# Altium footprint library Conectori.PcbLib: 65 footprints (part 3 of 5)
Each footprint in its own frame and in the unit in brackets; x right, y up, seen from the top. Pads: shape width x height; smd on the part's side, far side on the other; paste and mask are expansions set on the pad; w line width, h text height; cw(c..) or ccw(c..) is an arc to the next point about the centre after c.
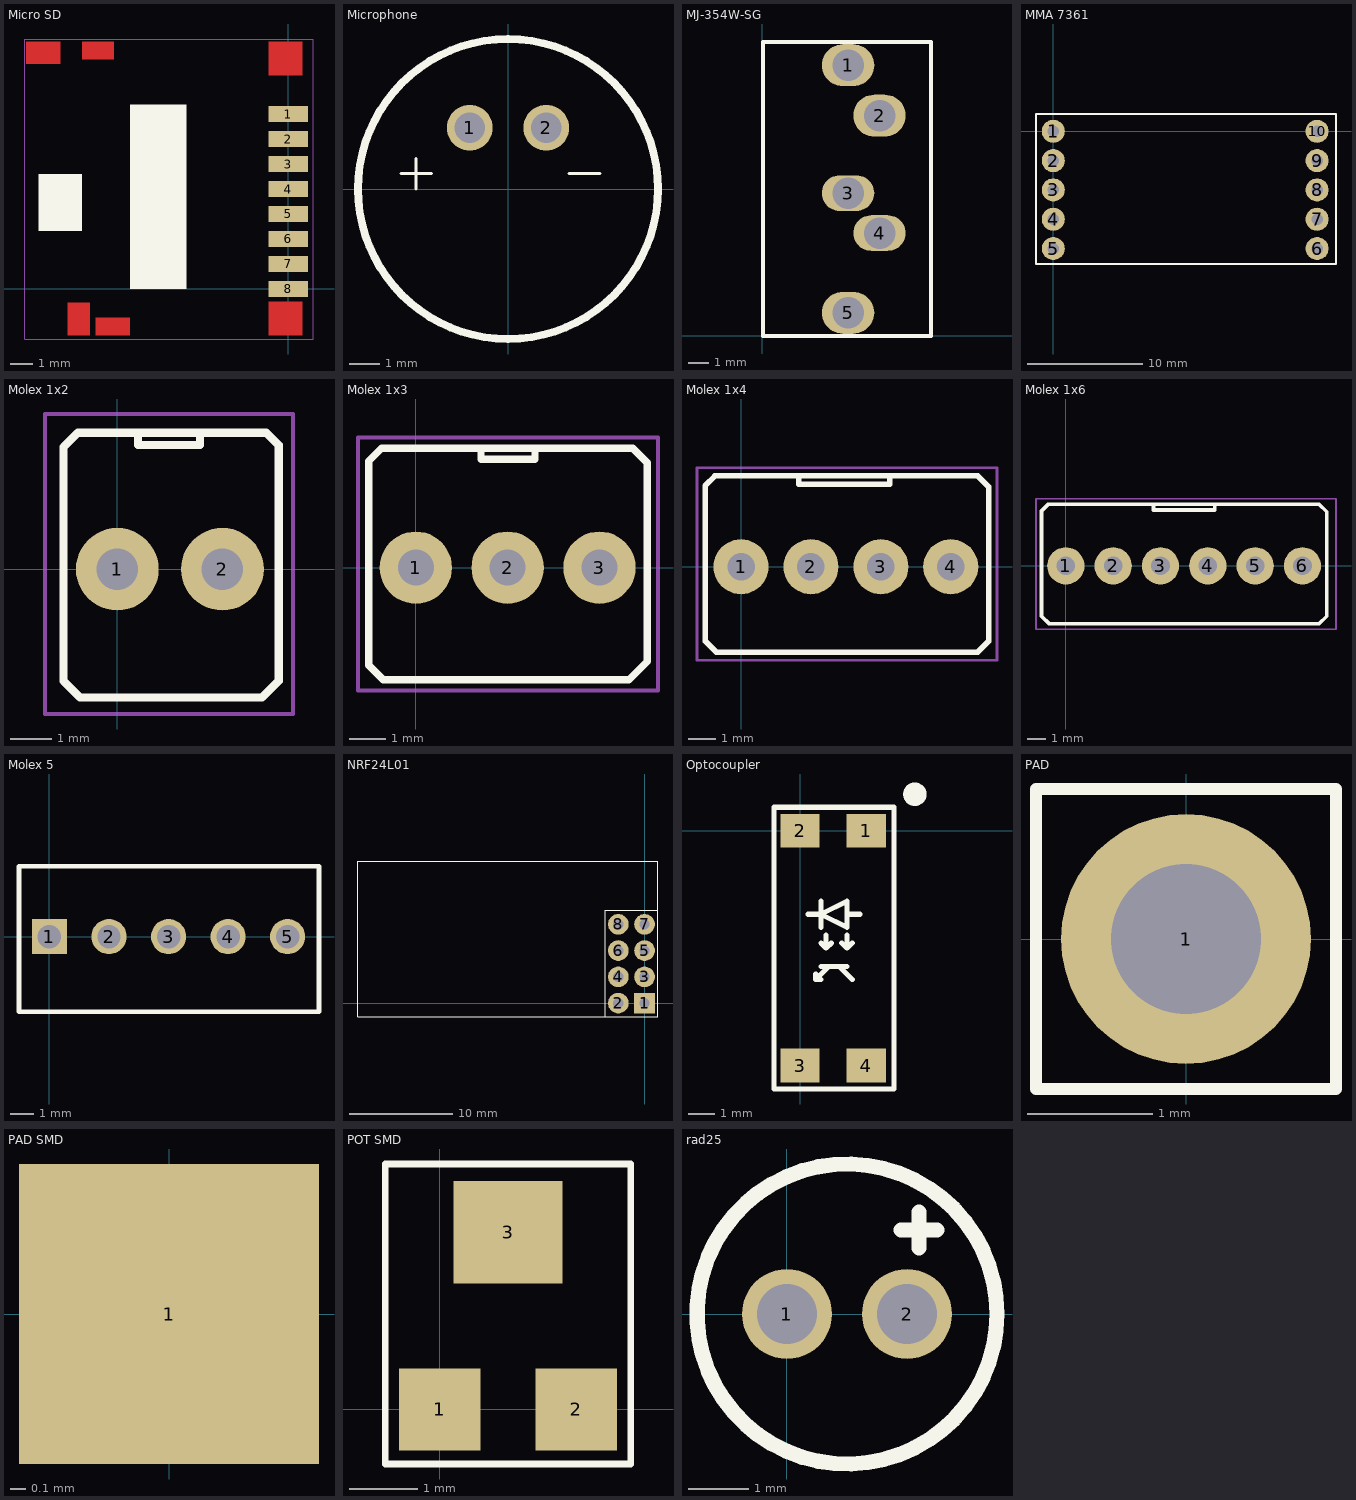
[diagram p2: the footprints below, top view; thin cyan lines are the x and y axes]

## Micro SD [mm]
height 1.55
pads (8):
  rect 1.75x0.7 smd: 1(0,7.7) 2(0,6.6) 3(0,5.5) 4(0,4.4) 5(0,3.3) 6(0,2.2) 7(0,1.1) 8(0,0)
Top Layer:
  rectangle: -9.075,10.1 -7.675,10.9
  rectangle: -9.725,-2.05 -8.725,-0.6
  rectangle: -8.475,-2.05 -6.975,-1.25
  rectangle: -0.875,9.4 0.625,10.9
  rectangle: -0.875,-2.05 0.625,-0.55
  rectangle: -11.55,9.9 -10.025,10.9
Top Overlay:
  rectangle: -11,2.55 -9.075,5.05
  rectangle: -6.975,0 -4.475,8.125
Mechanical 15:
  lines w0.05: -11.6,-2.2 -11.6,11 1.1,11 1.1,-2.2 -11.6,-2.2
3D body "User Library-49225-0811 micro sd.step": height 1.05, standoff -0.93, extent -13.2,-4.025 2.9,13.025

## Microphone [mm]
pads (2):
  round 1.5 hole 1: 1(-1.25,2) 2(1.25,2)
Top Overlay:
  circle w0.254: c0,0 r4.9
  lines w0.1: -3.5,0.5 -2.75,0.5 -2.5,0.5 ; -3,0 -3,1 ; 2,0.5 3,0.5
3D body "User Library-Panasonic_Microphone_WM52BM.step": height 5.15, standoff -4.02, extent -4.85,-4.85 4.85,4.85

## MJ-354W-SG [mm]
pads (5):
  oval 2.5x2 hole 1.5: 1(4.1,12.9) 2(5.6,10.5) 5(4.1,1.1)
  oval 2.5x1.7 hole 1.5: 3(4.1,6.8) 4(5.6,4.9)
Top Layer:
  lines w0.2: 3.2,1.4 4.7,1.4 ; 3.35,6.8 4.85,6.8 ; 3.35,12.9 4.85,12.9 ; 4.85,4.9 6.35,4.9 ; 4.85,10.5 6.35,10.5
Top Overlay:
  lines w0.2: 4.85,14 8.05,14 ; 8.05,14 8.05,0 0.05,0 0.05,14 8.05,14
3D body "mj-3502n.stp": height 11.4, standoff -4.4, extent 0.398,-0.075 7.752,18.425

## MMA 7361 [mm] "Accelerometer"
pads (10):
  round 2 hole 1: 1(0,0) 2(0,-2.54) 3(0,-5.08) 4(0,-7.62) 5(0,-10.16) 6(22.86,-10.16) 7(22.86,-7.62) 8(22.86,-5.08) 9(22.86,-2.54) 10(22.86,0)
Top Overlay:
  lines w0.2: -1.5,-11.5 24.5,-11.5 24.5,1.5 -1.5,1.5 -1.5,-11.5

## Molex 1x2 [mm]
height 13
pads (2):
  round 2 hole 1: 1(0,0) 2(2.54,0)
Top Overlay:
  lines w0.2: 0.5,3.3 0.5,3 2,3 2,3.3 ; -1.3,-2.7 -0.9,-3.1 0.9,-3.1 3.5,-3.1 3.9,-2.7 3.9,3 3.6,3.3 -0.95,3.3 -1.3,2.95 -1.3,-2.7
Mechanical 15:
  lines w0.1: -1.75,-3.5 -1.75,3.75 4.25,3.75 4.25,-3.5 -1.75,-3.5
3D body "SW3dPS-Molex - 2-Pin Header with Lock (0.100in pitch).STEP": height 10.69, standoff -3.53, extent -1.24,-3.1 3.84,3.25

## Molex 1x3 [mm]
height 10
pads (3):
  round 2 hole 1: 1(0,0) 2(2.54,0) 3(5.08,0)
Top Overlay:
  lines w0.2: 1.8,3.3 1.8,3 3.3,3 3.3,3.3 ; -1.3,-2.7 -0.9,-3.1 0.9,-3.1 5.9,-3.1 6.4,-2.6 6.4,2.9 6,3.3 -0.95,3.3 -1.3,2.95 -1.3,-2.7
Mechanical 15:
  lines w0.1: -1.6,-3.4 -1.6,3.6 6.7,3.6 6.7,-3.4 -1.6,-3.4
3D body "SW3dPS-Molex - 3-Pin Header with Lock (0.100in pitch).STEP": height 10.69, standoff -3.53, extent -1.32,-3.075 6.3,3.275

## Molex 1x4 [mm]
height 10
pads (4):
  round 2 hole 1: 1(0,0) 2(2.54,0) 3(5.08,0) 4(7.62,0)
Top Overlay:
  lines w0.2: 2.1,3.3 2.1,3 5.4,3 5.4,3.3 ; -1.3,-2.7 -0.9,-3.1 0.9,-3.1 8.6,-3.1 9,-2.7 9,2.9 8.6,3.3 -0.95,3.3 -1.3,2.95 -1.3,-2.7
Mechanical 15:
  lines w0.1: -1.6,-3.4 -1.6,3.6 9.3,3.6 9.3,-3.4 -1.6,-3.4
3D body "User Library-Molex 4 pines.step": height 11.5, standoff -3.2, extent -1.25,-3.1 8.9,2.9

## Molex 1x6 [mm]
height 10
pads (6):
  round 2 hole 1: 1(0,0) 2(2.54,0) 3(5.08,0) 4(7.62,0) 5(10.16,0) 6(12.7,0)
Top Overlay:
  lines w0.2: 4.7,3.3 4.7,3 8,3 8,3.3 ; -1.3,-2.7 -0.9,-3.1 0.9,-3.1 13.6,-3.1 14,-2.7 14,2.9 13.6,3.3 -0.95,3.3 -1.3,2.95 -1.3,-2.7
Mechanical 15:
  lines w0.1: -1.6,-3.4 -1.6,3.6 14.5,3.6 14.5,-3.4 -1.6,-3.4
3D body "User Library-Molex 6 pines.step": height 11.5, standoff -3.2, extent -1.13,-3 13.93,3

## Molex 5 [mm]
pads (5):
  rect 1.5x1.5 hole 1: 1(0,0)
  round 1.5 hole 1: 2(2.54,0) 3(5.08,0) 4(7.62,0) 5(10.16,0)
Top Overlay:
  lines w0.2: -1.3,-3.2 -1.3,3 11.5,3 11.5,-3.2 -1.3,-3.2
3D body "User Library-Molex 5 pines.step": height 11.5, standoff -3.2, extent -1.16,-3.1 11.36,2.9

## NRF24L01 [mm]
pads (8):
  rect 2x2 hole 1: 1(0,0)
  round 2 hole 1: 2(-2.54,0) 3(0,2.54) 4(-2.54,2.54) 5(0,5.08) 6(-2.54,5.08) 7(0,7.62) 8(-2.54,7.62)
Top Overlay:
  lines w0.1: -3.8,-1.3 -3.8,9 1.3,9 ; -27.7,-1.3 1.3,-1.3 1.3,13.7 -27.7,13.7 -27.7,-1.3

## Optocoupler [mm]
height 5
pads (4):
  rect 1.5x1.3 smd: 1(2.54,0) 2(0,0) 3(0,-9) 4(2.54,-9)
Top Overlay:
  circle w0.5: c4.4,1.4 r0.2
  lines w0.2: 0.3,-3.2 0.8,-3.2 ; 0.6,-5.5 0.6,-5.7 ; 0.8,-5.7 0.6,-5.7 ; 0.8,-5.2 1.8,-5.2 ; 0.8,-4.3 1,-4.5 ; 0.8,-3.7 0.8,-2.7 ; 1,-4 1,-4.5 ; 1.05,-5.25 0.6,-5.7 ; 1.2,-4.3 1,-4.5 ; 1.5,-5.2 2,-5.7 ; 1.6,-4.3 1.8,-4.5 ; 1.8,-4 1.8,-4.5 ; 1.8,-3.2 2.3,-3.2 ; 0.8,-3.2 1.8,-3.7 1.8,-2.7 0.8,-3.2 ; 1.8,-4.5 2,-4.3 1.8,-4.5 ; -1,-9.9 2.4,-9.9 3.6,-9.9 3.6,-0.3 3.6,0.9 -1,0.9 -1,-9.9
3D body "User Library-PC817_Gullwing.STEP": height 3.95, standoff 0.1, extent -1.09,-9.5 3.49,0.5

## OPTOCOUPLER 2 [mm]
height 2.1

## PAD [mm]
pads (1):
  round 2 hole 1.2: 1(0,0)
Top Overlay:
  lines w0.1: -1.2,-1.2 1.2,-1.2 1.2,0.6 1.2,1.2 -1.2,1.2 -1.2,-1.2
3D body "User Library-Header Vertical 2_54mm Pitch2-1.step": height 5.94, standoff -2.94, extent -1.275,-1.265 1.265,1.275

## PAD SMD [mm]
pads (1):
  rect 2x2 smd: 1(0,0)

## POT SMD [mm] "http://www.farnell.com/datasheets/1520225.pdf"
pads (3):
  rect 1.2x1.2 smd: 1(0,0) 2(2,0)
  rect 1.6x1.5 smd: 3(1,2.6)
Top Overlay:
  lines w0.1: -0.8,-0.8 2.8,-0.8 2.8,3.6 -0.8,3.6 -0.8,1.25 -0.8,-0.8

## rad25 [mm]
pads (2):
  round 1.5 hole 1 unplated: 1(0,0) 2(2,0)
Top Overlay:
  circle w0.254: c1,0 r2.5
  lines w0.254: 1.9,1.4 2.5,1.4 ; 2.2,1.1 2.2,1.7